# Altium footprint library CADTcommon.PcbLib: 503 footprints (part 15 of 32)
Each footprint in its own frame and in the unit in brackets; x right, y up, seen from the top. Pads: shape width x height; smd on the part's side, far side on the other; paste and mask are expansions set on the pad; w line width, h text height; cw(c..) or ccw(c..) is an arc to the next point about the centre after c.
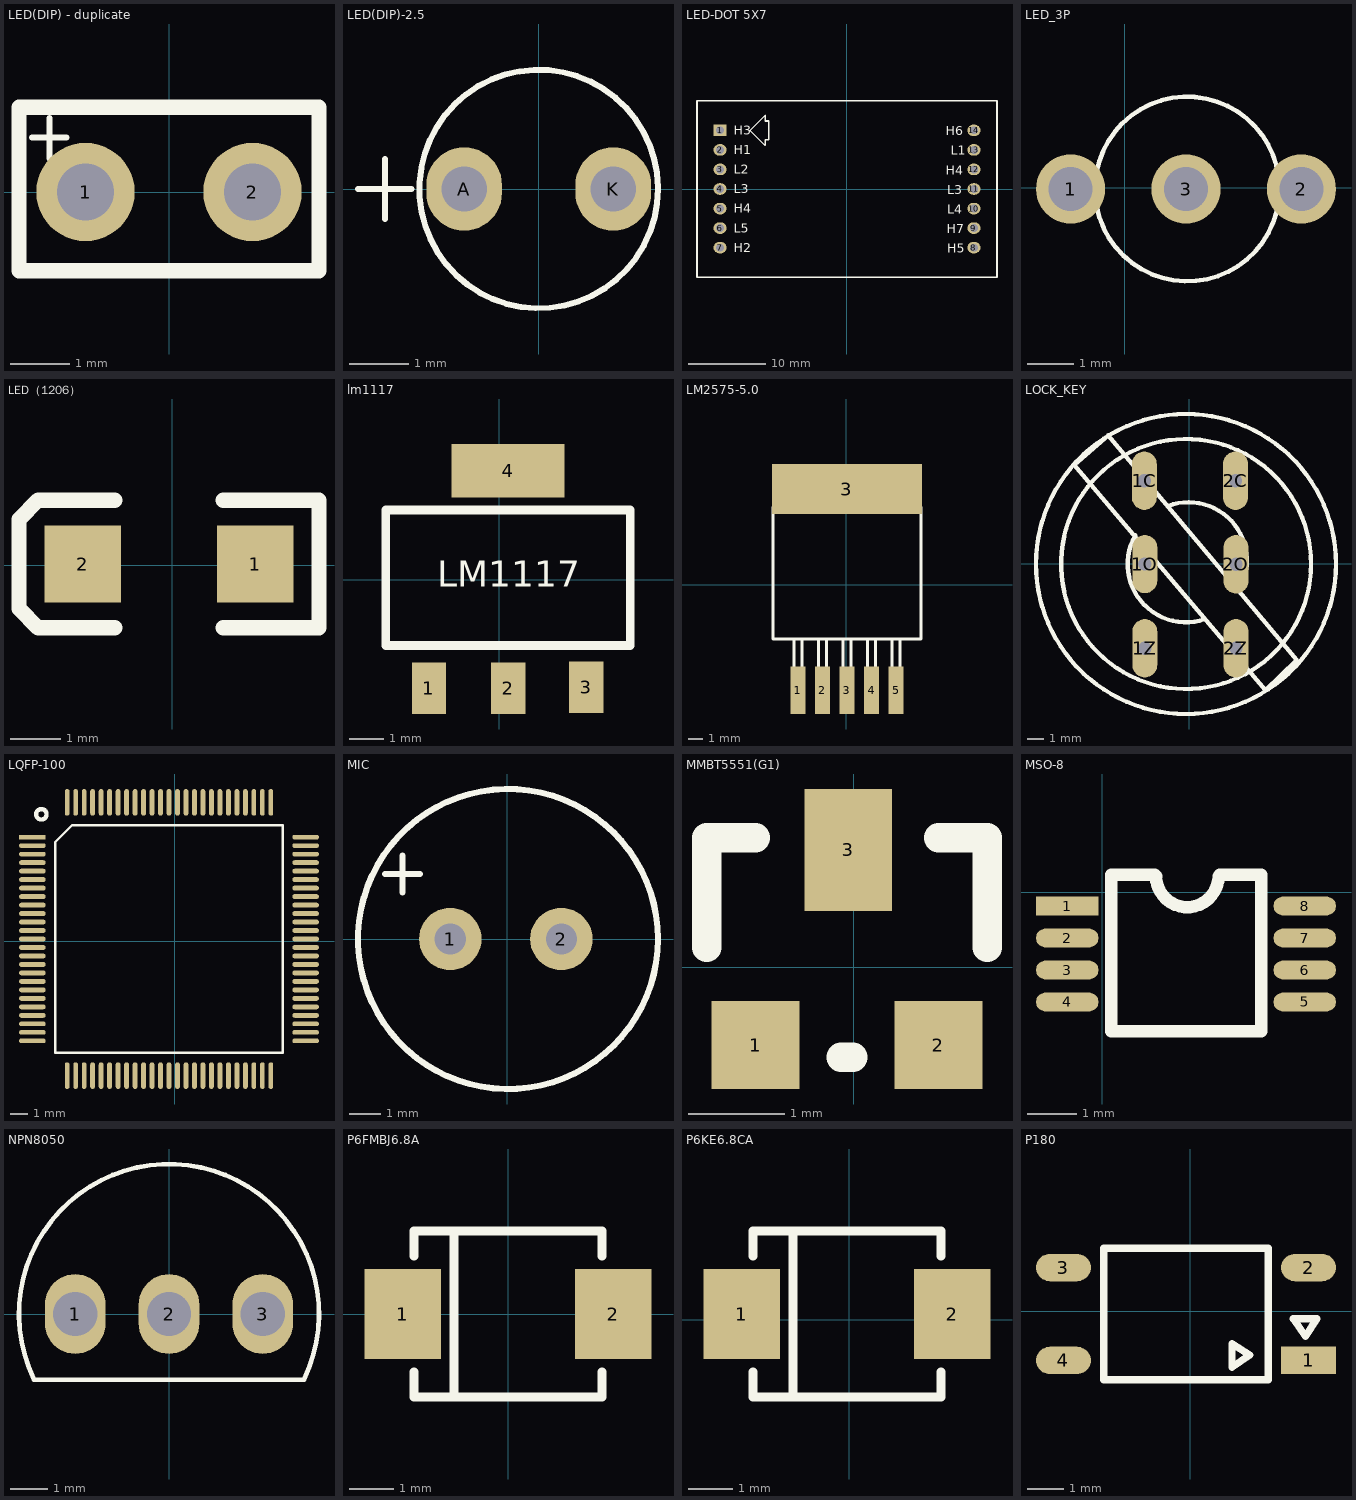
[diagram p14: the footprints below, top view; thin cyan lines are the x and y axes]

## LED(DIP) - duplicate [mm]
pads (2):
  round 1.65 hole 0.95: 1(-1.4,0) 2(1.4,0)
Top Overlay:
  lines w0.1: -2.299,0.914 -1.714,0.914 ; -2.006,0.559 -2.006,1.245
  lines w0.254: -2.515,-1.321 -2.515,1.422 2.515,1.422 2.515,-1.321 -2.515,-1.321

## LED(DIP)-2.5 [mil]
pads (2):
  oval 50x55 hole 30: A(-49.21,0) K(49.21,0)
Top Overlay:
  lines w3.94: -119.29,0 -83.86,0 ; -101.57,-19.68 -101.57,19.68 ; 78.74,0 cw(c0,0) 78.73,0.98
3D body: height 338.58, standoff -78.74, extent -112,-112 98.63,112.39

## LED-DOT 5X7 [mm]
pads (14):
  rect 1.7x1.5 hole 1: 1(-16.5,7.62)
  oval 1.7x1.5 hole 1: 2(-16.5,5.08) 3(-16.5,2.54) 4(-16.5,0) 5(-16.5,-2.54) 6(-16.5,-5.08) 7(-16.5,-7.62) 8(16.5,-7.62) 9(16.5,-5.08) 10(16.5,-2.54) 11(16.5,0) 12(16.5,2.54) 13(16.5,5.08) 14(16.5,7.62)
Top Overlay:
  lines w0.2: -19.5,-11.5 19.5,-11.5 19.5,11.5 -19.5,11.5 -19.5,-11.5 ; -12.598,7.62 -10.646,5.668 -10.646,6.402 -10.166,6.402 -10.166,8.838 -10.646,8.838 -10.646,9.572 -12.598,7.62
  text "H5" at 13.02,-8.279 h1.2
  text "H7" at 12.97,-5.739 h1.2
  text "L4" at 13.02,-3.199 h1.2
  text "L3" at 13.02,-0.659 h1.2
  text "H4" at 12.868,1.881 h1.2
  text "L1" at 13.464,4.421 h1.2
  text "H6" at 12.868,6.961 h1.2
  text "H2" at -14.722,-8.198 h1.2
  text "L5" at -14.722,-5.658 h1.2
  text "H4" at -14.722,-3.118 h1.2
  text "L3" at -14.722,-0.578 h1.2
  text "L2" at -14.722,1.962 h1.2
  text "H1" at -14.722,4.502 h1.2
  text "H3" at -14.722,7.042 h1.2
3D body: height 8.1, standoff -3.3, extent -19.322,-11.633 19.678,11.367

## LED_3P [mm]
pads (3):
  round 1.5 hole 0.95: 1(-1.174,-0.025) 2(3.826,-0.025) 3(1.326,-0.025)
Top Overlay:
  lines w0.1: 3.353,-0.025 cw(c1.353,-0.025) 3.353,0

## LED（1206） [mil]
pads (2):
  rect 60x60 smd: 1(65,0.9) 2(-70,0.9)
Top Overlay:
  lines w12: -45,-49.1 -105,-49.1 -120,-34.1 -120,35.9 -105,50.9 -45,50.9 ; 40,-49.1 115,-49.1 115,50.9 40,50.9

## lm1117 [mm]
pads (4):
  rect 1x1.5 smd: 1(-2.043,-3.148) 2(0.256,-3.148) 3(2.53,-3.123)
  rect 3.3x1.549 smd: 4(0.254,3.175)
Top Overlay:
  lines w0.254: -3.302,-1.905 -3.302,2.032 3.81,2.032 3.81,-1.905 -3.302,-1.905
  text "LM1117" at -1.8,-0.2 h0.76
3D body: height -0.38, standoff -2.08, extent -2.997,-3.48 3.503,3.48

## LM2575-5.0 [mil] "TO-263-5"
pads (6):
  rect 40x130 smd: 1(-132,-288) 2(-65,-288) 3(2,-288) 4(69,-288) 5(136,-288)
  rect 410x137.79 smd: 3(2,262)
Top Overlay:
  lines w7.87: -142.5,-226 -142.5,-148 ; -121.5,-226 -121.5,-148 ; -75.5,-226 -75.5,-148 ; -54.5,-226 -54.5,-148 ; -8.5,-226 -8.5,-148 ; 12.5,-226 12.5,-148 ; 58.5,-226 58.5,-148 ; 79.5,-226 79.5,-148 ; 125.5,-226 125.5,-148 ; 146.5,-226 146.5,-148 ; -200.5,-148 -200.5,212 204.5,212 204.5,-148 -200.5,-148
3D body: height 176.56, standoff 0, extent -199.25,-288 203.25,277

## LOCK_KEY [mm]
pads (6):
  oval 1.5x3.5 hole 0.8: 1C(-2.693,4.973) 1O(-2.663,-0.027) 1Z(-2.663,-5.082) 2C(2.777,4.973) 2O(2.807,-0.042) 2Z(2.807,-5.082)
Top Overlay:
  circle w0.254: c-0.193,-0.025 r9
  circle w0.254: c-0.186,-0.025 r7.5
  lines w0.254: -3.241,1.696 ccw(c-0.193,-0.025) 0.949,-3.333 ; -1.268,3.464 cw(c-0.043,0.185) 3.005,-1.535 ; -6.893,5.925 -4.853,7.695 6.447,-5.795 4.57,-7.594 -6.893,5.925
Mechanical 1:
  lines w1: -2.703,6.188 -2.693,3.778 ; -2.673,-3.867 -2.663,-6.277 ; -2.673,1.188 -2.663,-1.222 ; 2.767,6.188 2.777,3.778 ; 2.797,-3.867 2.807,-6.277 ; 2.797,1.173 2.807,-1.237

## LQFP-100 [mil]
pads (100):
  rect 62x11.02 smd: 1(-330,241)
  oval 62x11.02 smd: 2(-330,221.31) 3(-330,201.63) 4(-330,181.94) 5(-330,162.26) 6(-330,142.57) 7(-330,122.89) 8(-330,103.2) 9(-330,83.52) 10(-330,63.84) 11(-330,44.15) 12(-330,24.46) 13(-330,4.78) 14(-330,-14.9) 15(-330,-34.59) 16(-330,-54.27) 17(-330,-73.96) 18(-330,-93.64) 19(-330,-113.33) 20(-330,-133.01) 21(-330,-152.7) 22(-330,-172.38) 23(-330,-192.07) 24(-330,-211.75) 25(-330,-231.44) 51(303.87,-231.44) 52(303.87,-211.75) 53(303.87,-192.07) 54(303.87,-172.38) 55(303.87,-152.7) 56(303.87,-133.01) 57(303.87,-113.33) 58(303.87,-93.64) 59(303.87,-73.96) 60(303.87,-54.27) 61(303.87,-34.59) 62(303.87,-14.9) 63(303.87,4.78) 64(303.87,24.46) 65(303.87,44.15) 66(303.87,63.84) 67(303.87,83.52) 68(303.87,103.2) 69(303.87,122.89) 70(303.87,142.57) 71(303.87,162.26) 72(303.87,181.94) 73(303.87,201.63) 74(303.87,221.31) 75(303.87,241)
  oval 11.02x62 smd: 26(-249.28,-312.16) 27(-229.6,-312.16) 28(-209.91,-312.16) 29(-190.23,-312.16) 30(-170.54,-312.16) 31(-150.86,-312.16) 32(-131.17,-312.16) 33(-111.49,-312.16) 34(-91.8,-312.16) 35(-72.12,-312.16) 36(-52.43,-312.16) 37(-32.75,-312.16) 38(-13.06,-312.16) 39(6.62,-312.16) 40(26.31,-312.16) 41(45.99,-312.16) 42(65.68,-312.16) 43(85.36,-312.16) 44(105.05,-312.16) 45(124.73,-312.16) 46(144.42,-312.16) 47(164.1,-312.16) 48(183.79,-312.16) 49(203.47,-312.16) 50(223.16,-312.16) 76(223.16,321.72) 77(203.47,321.72) 78(183.79,321.72) 79(164.1,321.72) 80(144.42,321.72) 81(124.73,321.72) 82(105.05,321.72) 83(85.36,321.72) 84(65.68,321.72) 85(45.99,321.72) 86(26.31,321.72) 87(6.62,321.72) 88(-13.06,321.72) 89(-32.75,321.72) 90(-52.43,321.72) 91(-72.12,321.72) 92(-91.8,321.72) 93(-111.49,321.72) 94(-131.17,321.72) 95(-150.86,321.72) 96(-170.54,321.72) 97(-190.23,321.72) 98(-209.91,321.72) 99(-229.6,321.72) 100(-249.28,321.72)
Top Overlay:
  circle w10: c-309.17,294 r12.16
  lines w5.91: -277.24,-259.39 251.11,-259.39 251.11,268.95 -237.47,268.95 -277.24,229.19 -277.24,-259.39

## MIC [mm]
pads (2):
  round 2 hole 1: 1(-1.819,0) 2(1.737,0)
Top Overlay:
  circle w0.2: c0.028,0 r4.8
  lines w0.2: -3.905,2.083 -2.787,2.083 ; -3.346,1.499 -3.346,2.667

## MMBT5551(G1) [mil]
pads (3):
  rect 36x36 smd: 1(-40.26,-32.01) 2(34.74,-32.01)
  rect 36x50 smd: 3(-2.26,47.99)
Top Overlay:
  lines w12: -60.26,7.99 -60.26,52.99 -40.26,52.99 ; -5.26,-37.01 -0.26,-37.01 ; 34.74,52.99 54.74,52.99 54.74,7.99

## MSO-8 [mil]
pads (8):
  rect 50x15 smd: 1(-28,-11)
  oval 50x15 smd: 2(-28,-36.6) 3(-28,-62.2) 4(-28,-87.8) 5(162,-87.8) 6(162,-62.2) 7(162,-36.6) 8(162,-11)
Top Overlay:
  lines w10: 42,14 7,14 7,-111 127,-111 127,14 94,14 ; 43,13 ccw(c68,13) 93,13

## NPN8050 [mil]
pads (3):
  oval 65x85 hole 47.24: 1(-100,0) 2(0,0) 3(100,0)
Top Overlay:
  lines w5: -144.36,-70 144.36,-70 ; -144.36,-69.18 cw(c0,0) 144.36,-69.18
3D body: height 393.7, standoff 118.11, extent -161,-70 162,161
3D body: height 118.11, standoff -78.74, extent 80,-20.64 119.22,18.65
3D body: height 118.11, standoff -78.74, extent -20,-20.64 19.22,18.65
3D body: height 118.11, standoff -78.74, extent -120.21,-19.64 -81,19.65

## P6FMBJ6.8A [mm]
pads (2):
  rect 1.7x2 smd: 1(-2.35,0) 2(2.35,0)
Top Overlay:
  lines w0.2: -2.1,-1.295 -2.1,-1.85 2.1,-1.85 2.1,-1.295 ; -2.1,1.295 -2.1,1.85 2.1,1.85 2.1,1.295 ; -1.211,-1.85 -1.211,1.85
3D body: height 2.5, standoff 0, extent -2.775,-1.95 2.825,1.95

## P6KE6.8CA [mm]
pads (2):
  rect 1.7x2 smd: 1(-2.395,0.126) 2(2.305,0.126)
Top Overlay:
  lines w0.2: -2.145,-1.169 -2.145,-1.724 2.055,-1.724 2.055,-1.169 ; -2.145,1.422 -2.145,1.976 2.055,1.976 2.055,1.422 ; -1.256,-1.724 -1.256,1.976

## P180 [mm]
pads (4):
  rect 1.5x0.75 smd: 1(3.234,-1.339)
  oval 1.5x0.75 smd: 2(3.234,1.201) 3(-3.466,1.201) 4(-3.466,-1.339)
Top Overlay:
  lines w0.2: -2.366,-1.869 -2.366,1.731 2.134,1.731 2.134,-1.869 -2.366,-1.869 ; 1.143,-1.52 1.143,-0.885 1.626,-1.19 1.143,-1.52 ; 2.82,-0.199 3.15,-0.682 3.455,-0.199 2.82,-0.199
3D body: height 2.77, standoff -0.04, extent -3.884,-1.819 3.716,1.667